# Altium footprint library texas.PCBLIB: 168 footprints (part 10 of 14)
Each footprint in its own frame and in the unit in brackets; x right, y up, seen from the top. Pads: shape width x height; smd on the part's side, far side on the other; paste and mask are expansions set on the pad; w line width, h text height; cw(c..) or ccw(c..) is an arc to the next point about the centre after c.
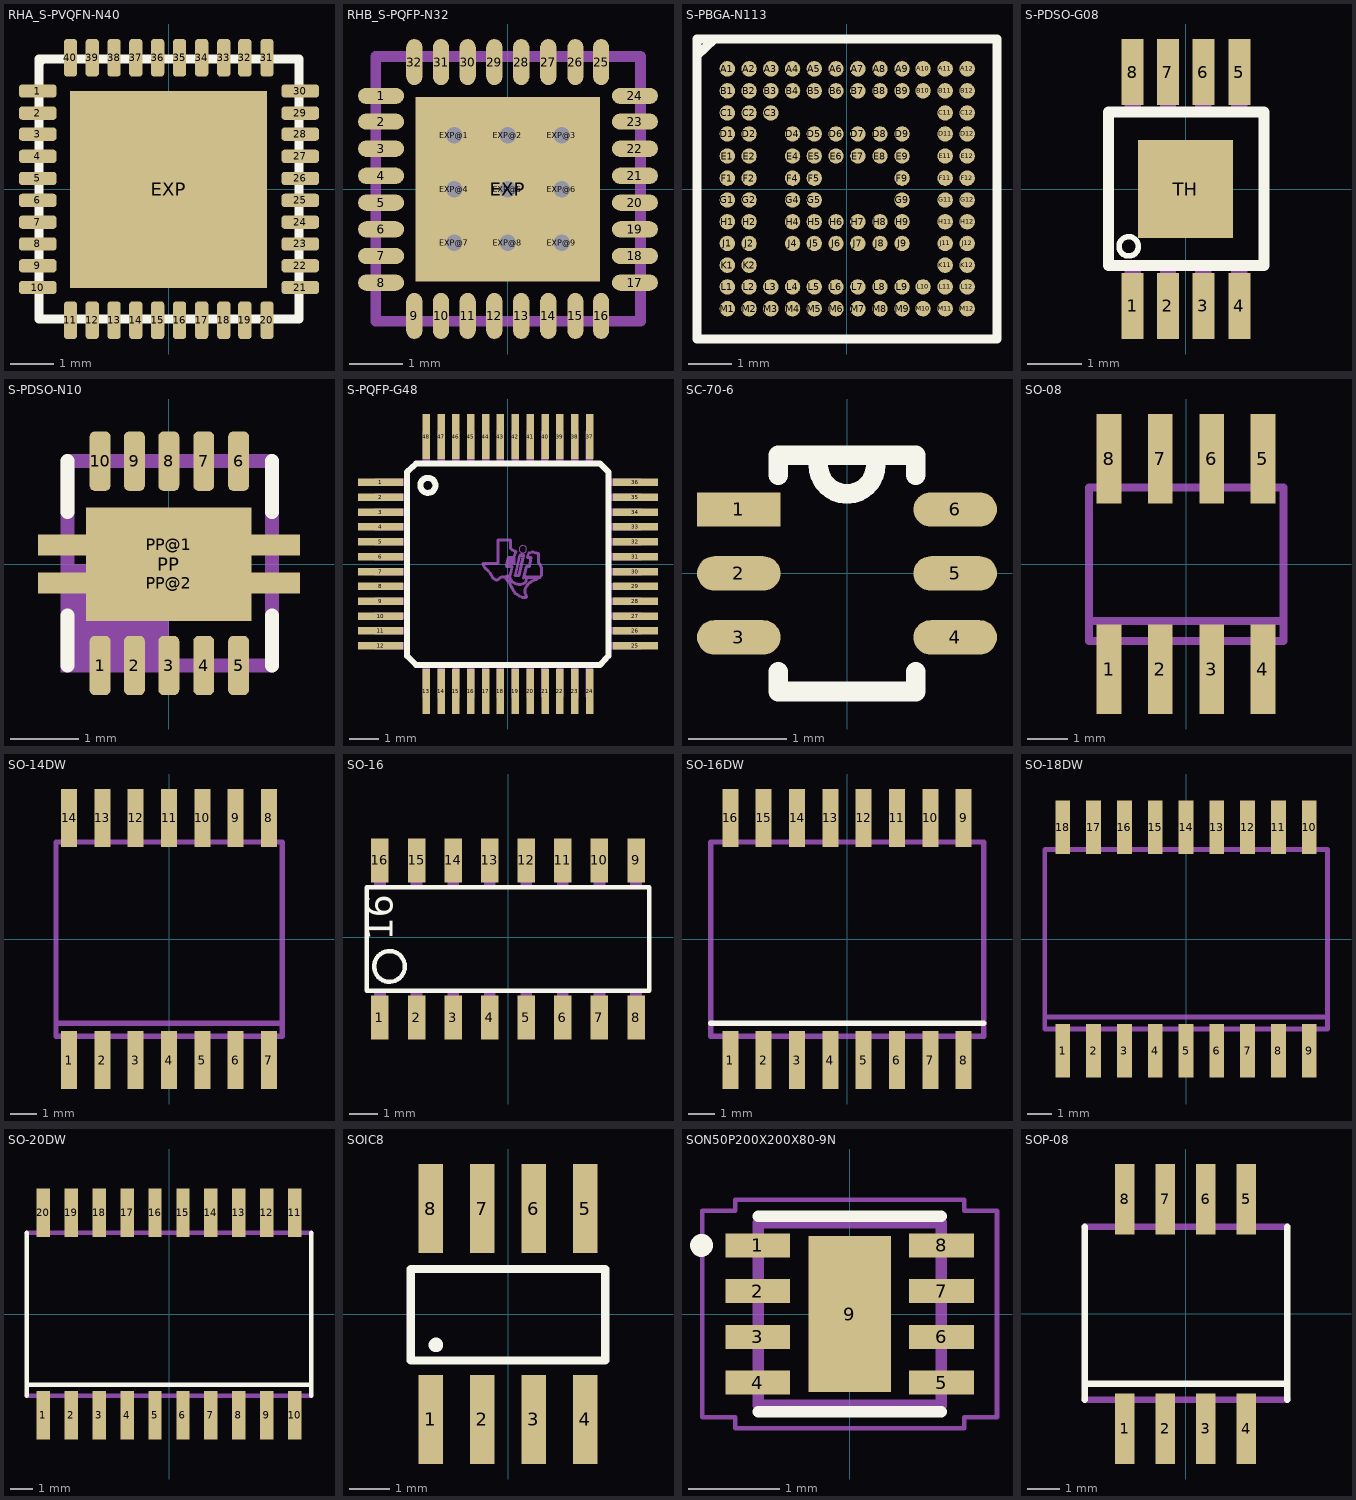
[diagram p9: the footprints below, top view; thin cyan lines are the x and y axes]

## RHA_S-PVQFN-N40 [mil]
pads (41):
  rrect50% 34x12 smd: 1(-118.11,89) 2(-118.11,69) 3(-118.11,50) 4(-118.11,30) 5(-118.11,10) 6(-118.11,-9.84) 7(-118.11,-29.53) 8(-118.11,-49.21) 9(-118.11,-68.9) 10(-118.11,-88.58) 21(119,-88.58) 22(119,-68.9) 23(119,-49.21) 24(119,-29.53) 25(119,-9.84) 26(119,10) 27(119,30) 28(119,50) 29(119,69) 30(119,89)
  rrect50% 12x34 smd: 11(-88.58,-118.11) 12(-68.9,-118.11) 13(-49.21,-118.11) 14(-29.53,-118.11) 15(-9.84,-118.11) 16(10,-118.11) 17(30,-118.11) 18(50,-118.11) 19(69,-118.11) 20(89,-118.11) 31(89,119) 32(69,119) 33(50,119) 34(30,119) 35(10,119) 36(-9.84,119) 37(-29.53,119) 38(-49.21,119) 39(-68.9,119) 40(-88.58,119)
  rect 178x178 smd: EXP(0,0)
Top Overlay:
  lines w8: -117.06,114 -113.19,118 ; -117.06,-117.06 -117.06,118 118,118 118,-117.06 -117.06,-117.06
Top Paste:
  circle w0: c-88.58,108 r5
  circle w0: c-68.9,108 r5
  circle w0: c-49.21,108 r5
  circle w0: c-29.53,108 r5
  circle w0: c-9.84,108 r5
  circle w0: c10,108 r5
  circle w0: c30,108 r5
  circle w0: c50,108 r5
  circle w0: c69,108 r5
  circle w0: c89,108 r5
  circle w0: c108,89 r5
  circle w0: c108,69 r5
  circle w0: c108,50 r5
  circle w0: c108,30 r5
  circle w0: c108,10 r5
  circle w0: c108,-9.84 r5
  circle w0: c108,-29.53 r5
  circle w0: c108,-49.21 r5
  circle w0: c108,-68.9 r5
  circle w0: c108,-88.58 r5
  circle w0: c89,-107.28 r5
  circle w0: c69,-107.28 r5
  circle w0: c50,-107.28 r5
  circle w0: c30,-107.28 r5
  circle w0: c10,-107.28 r5
  circle w0: c-9.84,-107.28 r5
  circle w0: c-29.53,-107.28 r5
  circle w0: c-49.21,-107.28 r5
  circle w0: c-68.9,-107.28 r5
  circle w0: c-88.58,-107.28 r5
  circle w0: c-107.28,-88.58 r5
  circle w0: c-107.28,-68.9 r5
  circle w0: c-107.28,-49.21 r5
  circle w0: c-107.28,-29.53 r5
  circle w0: c-107.28,-9.84 r5
  circle w0: c-107.28,10 r5
  circle w0: c-107.28,30 r5
  circle w0: c-107.28,50 r5
  circle w0: c-107.28,69 r5
  circle w0: c-107.28,89 r5
  rectangle: 30,-76.77 77,-29.53
  rectangle: -23.62,-76.77 24,-29.53
  rectangle: -76.77,-76.77 -29.53,-29.53
  rectangle: 30,30 77,77
  rectangle: -23.62,30 24,77
  rectangle: 30,-23.62 77,24
  rectangle: -76.77,-23.62 -29.53,24
  rectangle: -23.62,-23.62 24,24
  rectangle: -76.77,30 -29.53,77
  region: -93.08,133.3 -93.08,107.7 -84.08,107.7 -84.08,133.3
  region: -73.4,133.3 -73.4,107.7 -64.4,107.7 -64.4,133.3
  region: -53.71,133.3 -53.71,107.7 -44.71,107.7 -44.71,133.3
  region: -34.03,133.3 -34.03,107.7 -25.03,107.7 -25.03,133.3
  region: -14.32,133.32 -14.32,107.68 -5.32,107.68 -5.32,133.32
  region: 5.52,133.48 5.52,107.52 14.52,107.52 14.52,133.48
  region: 25.5,133.5 25.5,107.5 34.5,107.5 34.5,133.5
  region: 45.5,133.5 45.5,107.5 54.5,107.5 54.5,133.5
  region: 65,133 65,108 74,108 74,133
  region: 84.5,133.5 84.5,107.5 93.5,107.5 93.5,133.5
  region: 133,94 108,94 108,84 133,84
  region: 133,74 108,74 108,64 133,64
  region: 133,55 108,55 108,45 133,45
  region: 133,35 108,35 108,25 133,25
  region: 133,15 108,15 108,5 133,5
  region: 133,-4.92 108,-4.92 108,-14.76 133,-14.76
  region: 133,-24.61 108,-24.61 108,-34.45 133,-34.45
  region: 133,-44.29 108,-44.29 108,-54.13 133,-54.13
  region: 133,-63.98 108,-63.98 108,-73.82 133,-73.82
  region: 133,-83.66 108,-83.66 108,-93.5 133,-93.5
  region: 93.92,-133.08 93.92,-107.08 84.08,-107.08 84.08,-133.08
  region: 74.42,-132.58 74.42,-107.58 64.58,-107.58 64.58,-132.58
  region: 54.92,-133.08 54.92,-107.08 45.08,-107.08 45.08,-133.08
  region: 34.92,-133.08 34.92,-107.08 25.08,-107.08 25.08,-133.08
  region: 14.94,-133.06 14.94,-107.1 5.1,-107.1 5.1,-133.06
  region: -4.9,-132.9 -4.9,-107.26 -14.74,-107.26 -14.74,-132.9
  region: -24.61,-132.87 -24.61,-107.28 -34.45,-107.28 -34.45,-132.87
  region: -44.29,-132.87 -44.29,-107.28 -54.13,-107.28 -54.13,-132.87
  region: -63.98,-132.87 -63.98,-107.28 -73.82,-107.28 -73.82,-132.87
  region: -83.66,-132.87 -83.66,-107.28 -93.5,-107.28 -93.5,-132.87
  rectangle: -132.87,-93.5 -107.28,-83.66
  rectangle: -132.87,-73.82 -107.28,-63.98
  rectangle: -132.87,-54.13 -107.28,-44.29
  rectangle: -132.87,-34.45 -107.28,-24.61
  rectangle: -132.87,-14.76 -107.28,-4.92
  rectangle: -132.87,5 -107.28,15
  rectangle: -132.87,25 -107.28,35
  rectangle: -132.87,45 -107.28,55
  rectangle: -132.87,64 -107.28,74
  rectangle: -132.87,84 -107.28,94
Top Solder:
  drawing of 41 lines, arcs and shapes, not listed
Mechanical 4:
  rectangle: -93.11,122 -84.06,134
  rectangle: -73.43,122 -64.37,134
  rectangle: -53.74,122 -44.69,134
  rectangle: -34.06,122 -25,134
  rectangle: -14.37,122 -5.32,134
  rectangle: 6,122 15,134
  rectangle: 25,122 35,134
  rectangle: 45,122 54,134
  rectangle: 65,122 74,134
  rectangle: 85,122 94,134
  rectangle: 122,85 134,94
  rectangle: 122,65 134,74
  rectangle: 122,45 134,54
  rectangle: 122,25 134,35
  rectangle: 122,6 134,15
  rectangle: 122,-14.37 134,-5.32
  rectangle: 122,-34.06 134,-25
  rectangle: 122,-53.74 134,-44.69
  rectangle: 122,-73.43 134,-64.37
  rectangle: 122,-93.11 134,-84.06
  rectangle: 85,-133.86 94,-121.06
  rectangle: 65,-133.86 74,-121.06
  rectangle: 45,-133.86 54,-121.06
  rectangle: 25,-133.86 35,-121.06
  rectangle: 6,-133.86 15,-121.06
  rectangle: -14.37,-133.86 -5.32,-121.06
  rectangle: -34.06,-133.86 -25,-121.06
  rectangle: -53.74,-133.86 -44.69,-121.06
  rectangle: -73.43,-133.86 -64.37,-121.06
  rectangle: -93.11,-133.86 -84.06,-121.06
  rectangle: -133.86,-93.11 -121.06,-84.06
  rectangle: -133.86,-73.43 -121.06,-64.37
  rectangle: -133.86,-53.74 -121.06,-44.69
  rectangle: -133.86,-34.06 -121.06,-25
  rectangle: -133.86,-14.37 -121.06,-5.32
  rectangle: -133.86,6 -121.06,15
  rectangle: -133.86,25 -121.06,35
  rectangle: -133.86,45 -121.06,54
  rectangle: -133.86,65 -121.06,74
  rectangle: -133.86,85 -121.06,94

## RHB_S-PQFP-N32 [mil]
pads (42):
  rrect100% 34x12 smd: 1(-93.5,69) 2(-93.5,50) 3(-93.5,30) 4(-93.5,10) 5(-93.5,-9.84) 6(-93.5,-29.53) 7(-93.5,-49.21) 8(-93.5,-68.9) 17(94,-68.9) 18(94,-49.21) 19(94,-29.53) 20(94,-9.84) 21(94,10) 22(94,30) 23(94,50) 24(94,69)
  rrect100% 12x34 smd: 9(-68.9,-93.5) 10(-49.21,-93.5) 11(-29.53,-93.5) 12(-9.84,-93.5) 13(10,-93.5) 14(30,-93.5) 15(50,-93.5) 16(69,-93.5) 25(69,94) 26(50,94) 27(30,94) 28(10,94) 29(-9.84,94) 30(-29.53,94) 31(-49.21,94) 32(-68.9,94)
  rect 136x136 smd: EXP(0,0)
  round 24 hole 12: EXP@1(-39.37,40) EXP@2(0,40) EXP@3(40,40) EXP@4(-39.37,0) EXP@5(0,0) EXP@6(40,0) EXP@7(-39.37,-39.37) EXP@8(0,-39.37) EXP@9(40,-39.37)
Top Paste:
  region: 6,63 6,6 63,6 63,63
  region: 63,-5.91 6,-5.91 6,-62.99 63,-62.99
  region: -5.91,-62.99 -5.91,-5.91 -62.99,-5.91 -62.99,-62.99
  rectangle: -62.99,6 -5.91,63
  lines w12: -104.33,-68.9 -82.68,-68.9 ; -104.33,-49.21 -82.68,-49.21 ; -104.33,-29.53 -82.68,-29.53 ; -104.33,-9.84 -82.68,-9.84 ; -104.33,10 -82.68,10 ; -104.33,30 -82.68,30 ; -104.33,50 -82.68,50 ; -104.33,69 -82.68,69 ; -68.9,-104.33 -68.9,-82.68 ; -68.9,83 -68.9,105 ; -49.21,-104.33 -49.21,-82.68 ; -49.21,83 -49.21,105 ; -29.53,-104.33 -29.53,-82.68 ; -29.53,83 -29.53,105 ; -9.84,-104.33 -9.84,-82.68 ; -9.84,83 -9.84,105 ; 10,-104.33 10,-82.68 ; 10,83 10,105 ; 30,-104.33 30,-82.68 ; 30,83 30,105 ; 50,-104.33 50,-82.68 ; 50,83 50,105 ; 69,-104.33 69,-82.68 ; 69,83 69,105 ; 83,-68.9 105,-68.9 ; 83,-49.21 105,-49.21 ; 83,-29.53 105,-29.53 ; 83,-9.84 105,-9.84 ; 83,10 105,10 ; 83,30 105,30 ; 83,50 105,50 ; 83,69 105,69
Top Solder:
  rectangle: -68.9,-68.9 69,69
  lines w14: -104.33,-68.9 -82.68,-68.9 ; -104.33,-49.21 -82.68,-49.21 ; -104.33,-29.53 -82.68,-29.53 ; -104.33,-9.84 -82.68,-9.84 ; -104.33,10 -82.68,10 ; -104.33,30 -82.68,30 ; -104.33,50 -82.68,50 ; -104.33,69 -82.68,69 ; -68.9,-104.33 -68.9,-82.68 ; -68.9,83 -68.9,105 ; -49.21,-104.33 -49.21,-82.68 ; -49.21,83 -49.21,105 ; -29.53,-104.33 -29.53,-82.68 ; -29.53,83 -29.53,105 ; -9.84,-104.33 -9.84,-82.68 ; -9.84,83 -9.84,105 ; 10,-104.33 10,-82.68 ; 10,83 10,105 ; 30,-104.33 30,-82.68 ; 30,83 30,105 ; 50,-104.33 50,-82.68 ; 50,83 50,105 ; 69,-104.33 69,-82.68 ; 69,83 69,105 ; 83,-68.9 105,-68.9 ; 83,-49.21 105,-49.21 ; 83,-29.53 105,-29.53 ; 83,-9.84 105,-9.84 ; 83,10 105,10 ; 83,30 105,30 ; 83,50 105,50 ; 83,69 105,69
Mechanical 4:
  lines w8: -97.38,-97.38 -97.38,98 98,98 98,-97.38 -97.38,-97.38

## S-PBGA-N113 [mil]
pads (111):
  rrect100% 14x14 smd: A1(-108.27,109) A2(-88.58,109) A3(-68.9,109) A4(-49.21,109) A5(-29.53,109) A6(-9.84,109) A7(10,109) A8(30,109) A9(50,109) A10(69,109) A11(89,109) A12(109,109) B1(-108.27,89) B2(-88.58,89) B3(-68.9,89) B4(-49.21,89) B5(-29.53,89) B6(-9.84,89) B7(10,89) B8(30,89) B9(50,89) B10(69,89) B11(89,89) B12(109,89) C1(-108.27,69) C2(-88.58,69) C3(-68.9,69) C11(89,69) C12(109,69) D1(-108.27,50) D2(-88.58,50) D4(-49.21,50) D5(-29.53,50) D6(-9.84,50) D7(10,50) D8(30,50) D9(50,50) D11(89,50) D12(109,50) E1(-108.27,30) E2(-88.58,30) E4(-49.21,30) E5(-29.53,30) E6(-9.84,30) E7(10,30) E8(30,30) E9(50,30) E11(89,30) E12(109,30) F1(-108.27,10) F2(-88.58,10) F4(-49.21,10) F5(-29.53,10) F9(50,10) F11(89,10) F12(109,10) G1(-108.27,-9.84) G2(-88.58,-9.84) G4(-49.21,-9.84) G5(-29.53,-9.84) G9(50,-9.84) G11(89,-9.84) G12(109,-9.84) H1(-108.27,-29.53) H2(-88.58,-29.53) H4(-49.21,-29.53) H5(-29.53,-29.53) H6(-9.84,-29.53) H7(10,-29.53) H8(30,-29.53) H9(50,-29.53) H11(89,-29.53) H12(109,-29.53) J1(-108.27,-49.21) J2(-88.58,-49.21) J4(-49.21,-49.21) J5(-29.53,-49.21) J6(-9.84,-49.21) J7(10,-49.21) J8(30,-49.21) J9(50,-49.21) J11(89,-49.21) J12(109,-49.21) K1(-108.27,-68.9) K2(-88.58,-68.9) K11(89,-68.9) K12(109,-68.9) L1(-108.27,-88.58) L2(-88.58,-88.58) L3(-68.9,-88.58) L4(-49.21,-88.58) L5(-29.53,-88.58) L6(-9.84,-88.58) L7(10,-88.58) L8(30,-88.58) L9(50,-88.58) L10(69,-88.58) L11(89,-88.58) L12(109,-88.58) M1(-108.27,-108.27) M2(-88.58,-108.27) M3(-68.9,-108.27) M4(-49.21,-108.27) M5(-29.53,-108.27) M6(-9.84,-108.27) M7(10,-108.27) M8(30,-108.27) M9(50,-108.27) M10(69,-108.27) M11(89,-108.27) M12(109,-108.27)
Top Overlay:
  lines w8: -135.76,121 -120.08,136 ; -135.76,121 -135.76,-135.76 136,-135.76 136,136 -120.08,136 ; -135.76,121 -135.76,136 -120.08,136
Top Solder:
  circle w0: c30,-29.53 r7
  circle w0: c50,-49.21 r7
  circle w0: c-49.21,-49.21 r7
  circle w0: c50,50 r7
  circle w0: c-49.21,50 r7
  circle w0: c109,109 r7
  circle w0: c89,89 r7
  circle w0: c89,-88.58 r7
  circle w0: c109,-108.27 r7
  circle w0: c-88.58,-88.58 r7
  circle w0: c-108.27,-108.27 r7
  circle w0: c-108.27,109 r7
  circle w0: c-88.58,109 r7
  circle w0: c-68.9,109 r7
  circle w0: c-49.21,109 r7
  circle w0: c-29.53,109 r7
  circle w0: c-9.84,109 r7
  circle w0: c10,109 r7
  circle w0: c30,109 r7
  circle w0: c50,109 r7
  circle w0: c69,109 r7
  circle w0: c89,109 r7
  circle w0: c-108.27,89 r7
  circle w0: c-88.58,89 r7
  circle w0: c-68.9,89 r7
  circle w0: c-49.21,89 r7
  circle w0: c-29.53,89 r7
  circle w0: c-9.84,89 r7
  circle w0: c10,89 r7
  circle w0: c30,89 r7
  circle w0: c50,89 r7
  circle w0: c69,89 r7
  circle w0: c109,89 r7
  circle w0: c-108.27,69 r7
  circle w0: c-88.58,69 r7
  circle w0: c-68.9,69 r7
  circle w0: c89,69 r7
  circle w0: c109,69 r7
  circle w0: c-108.27,50 r7
  circle w0: c-88.58,50 r7
  circle w0: c-29.53,50 r7
  circle w0: c-9.84,50 r7
  circle w0: c10,50 r7
  circle w0: c30,50 r7
  circle w0: c89,50 r7
  circle w0: c109,50 r7
  circle w0: c-108.27,30 r7
  circle w0: c-88.58,30 r7
  circle w0: c-49.21,30 r7
  circle w0: c-29.53,30 r7
  circle w0: c-9.84,30 r7
  circle w0: c10,30 r7
  circle w0: c30,30 r7
  circle w0: c50,30 r7
  circle w0: c89,30 r7
  circle w0: c109,30 r7
  circle w0: c-108.27,10 r7
  circle w0: c-88.58,10 r7
  circle w0: c-49.21,10 r7
  circle w0: c-29.53,10 r7
  circle w0: c50,10 r7
  circle w0: c89,10 r7
  circle w0: c109,10 r7
  circle w0: c-108.27,-9.84 r7
  circle w0: c-88.58,-9.84 r7
  circle w0: c-49.21,-9.84 r7
  circle w0: c-29.53,-9.84 r7
  circle w0: c50,-9.84 r7
  circle w0: c89,-9.84 r7
  circle w0: c109,-9.84 r7
  circle w0: c-108.27,-29.53 r7
  circle w0: c-88.58,-29.53 r7
  circle w0: c-49.21,-29.53 r7
  circle w0: c-29.53,-29.53 r7
  circle w0: c-9.84,-29.53 r7
  circle w0: c10,-29.53 r7
  circle w0: c50,-29.53 r7
  circle w0: c89,-29.53 r7
  circle w0: c109,-29.53 r7
  circle w0: c-108.27,-49.21 r7
  circle w0: c-88.58,-49.21 r7
  circle w0: c-29.53,-49.21 r7
  circle w0: c-9.84,-49.21 r7
  circle w0: c10,-49.21 r7
  circle w0: c30,-49.21 r7
  circle w0: c89,-49.21 r7
  circle w0: c109,-49.21 r7
  circle w0: c-108.27,-68.9 r7
  circle w0: c-88.58,-68.9 r7
  circle w0: c89,-68.9 r7
  circle w0: c109,-68.9 r7
  circle w0: c-108.27,-88.58 r7
  circle w0: c-68.9,-88.58 r7
  circle w0: c-49.21,-88.58 r7
  circle w0: c-29.53,-88.58 r7
  circle w0: c-9.84,-88.58 r7
  circle w0: c10,-88.58 r7
  circle w0: c30,-88.58 r7
  circle w0: c50,-88.58 r7
  circle w0: c69,-88.58 r7
  circle w0: c109,-88.58 r7
  circle w0: c-88.58,-108.27 r7
  circle w0: c-68.9,-108.27 r7
  circle w0: c-49.21,-108.27 r7
  circle w0: c-29.53,-108.27 r7
  circle w0: c-9.84,-108.27 r7
  circle w0: c10,-108.27 r7
  circle w0: c30,-108.27 r7
  circle w0: c50,-108.27 r7
  circle w0: c69,-108.27 r7
  circle w0: c89,-108.27 r7

## S-PDSO-G08 [mil]
pads (9):
  rect 16x48 smd: 1(-38.39,-84.91) 2(-12.8,-84.91) 3(13,-84.91) 4(39,-84.91) 5(39,85) 6(13,85) 7(-12.8,85) 8(-38.39,85)
  rect 69x71 smd: TH(0,0)
Top Overlay:
  circle w4: c-41.34,-41.6 r7
  lines w8: -56.1,-55.38 -56.1,56 57,56 57,-55.38 -56.1,-55.38
Top Paste:
  rectangle: -32.48,-33.46 33,34
Top Solder:
  rectangle: -33.46,-34.45 34,35
Mechanical 4:
  region: -32.48,99 -44.29,99 -44.29,59 -32.48,59
  region: -6.89,99 -18.7,99 -18.7,59 -6.89,59
  region: 19,99 7,99 7,59 19,59
  region: 45,99 33,99 33,59 45,59
  rectangle: 33,-98.43 45,-58.53
  rectangle: 7,-98.43 19,-58.53
  rectangle: -18.7,-98.43 -6.89,-58.53
  rectangle: -44.29,-98.43 -32.48,-58.53

## S-PDSO-N10 [mil]
pads (13):
  rrect50% 12x34 smd: 1(-39.37,-58.07) 2(-19.68,-58.07) 3(0,-58.07) 4(20,-58.07) 5(40,-58.07) 6(40,59) 7(20,59) 8(0,59) 9(-19.68,59) 10(-39.37,59)
  rect 95x65 smd: PP(0,0)
  rect 150x12 smd: PP@1(0,11) PP@2(0,-10.83)
Top Overlay:
  lines w8: -58.07,-58.07 -58.07,-29.43 ; -58.07,30 -58.07,59 ; 59,-58.07 59,-29.43 ; 59,30 59,59
Top Paste:
  circle w0: c-39.37,46 r5
  circle w0: c-19.68,46 r5
  circle w0: c0,46 r5
  circle w0: c20,46 r5
  circle w0: c40,46 r5
  circle w0: c40,-45.87 r5
  circle w0: c20,-45.87 r5
  circle w0: c0,-45.87 r5
  circle w0: c-19.68,-45.87 r5
  circle w0: c-39.37,-45.87 r5
  region: 75,16 53,16 53,6 75,6
  region: 75,-5.91 53,-5.91 53,-15.75 75,-15.75
  region: -43.87,72.98 -43.87,46.02 -34.87,46.02 -34.87,72.98
  region: -24.19,72.98 -24.19,46.02 -15.19,46.02 -15.19,72.98
  region: -4.24,73.24 -4.24,45.76 4.76,45.76 4.76,73.24
  region: 16,73 16,46 25,46 25,73
  region: 35,73 35,46 44,46 44,73
  region: 44.03,-72.85 44.03,-45.85 34.97,-45.85 34.97,-72.85
  region: 25.03,-72.85 25.03,-45.85 15.97,-45.85 15.97,-72.85
  region: 4.79,-73.09 4.79,-45.61 -4.27,-45.61 -4.27,-73.09
  region: -15.16,-72.83 -15.16,-45.87 -24.21,-45.87 -24.21,-72.83
  region: -34.84,-72.83 -34.84,-45.87 -43.9,-45.87 -43.9,-72.83
  region: 47,32 6,32 6,6 47,6
  region: 47,-5.91 6,-5.91 6,-31.5 47,-31.5
  rectangle: -46.26,-31.5 -5.91,-5.91
  rectangle: -46.26,6 -5.91,32
  rectangle: -74.8,-15.75 -52.17,-5.91
  rectangle: -74.8,6 -52.17,16
Top Solder:
  circle w0: c-39.37,46 r7
  circle w0: c-19.68,46 r7
  circle w0: c0,46 r7
  circle w0: c20,46 r7
  circle w0: c40,46 r7
  circle w0: c40,-45.87 r7
  circle w0: c20,-45.87 r7
  circle w0: c0,-45.87 r7
  circle w0: c-19.68,-45.87 r7
  circle w0: c-39.37,-45.87 r7
  region: 76,17 53,17 53,5 76,5
  region: 76,-4.92 53,-4.92 53,-16.73 76,-16.73
  region: -32.48,76 -46.26,76 -46.26,46 -32.48,46
  region: -12.8,76 -26.57,76 -26.57,46 -12.8,46
  region: 7,76 -6.89,76 -6.89,46 7,46
  region: 27,76 13,76 13,46 27,46
  region: 47,76 33,76 33,46 47,46
  rectangle: 33,-75.79 47,-45.87
  rectangle: 13,-75.79 27,-45.87
  rectangle: -6.89,-75.79 7,-45.87
  rectangle: -26.57,-75.79 -12.8,-45.87
  rectangle: -46.26,-75.79 -32.48,-45.87
  rectangle: -48.23,-33.46 49,34
  rectangle: -75.79,-16.73 -52.17,-4.92
  rectangle: -75.79,5 -52.17,17
Mechanical 4:
  rectangle: -62.01,-62.01 0,0
  lines w8: -58.07,-58.07 -58.07,59 59,59 59,-58.07 -58.07,-58.07

## S-PQFP-G48 [mil]
pads (48):
  rect 60x10 smd: 1(-169.29,109) 2(-169.29,89) 3(-169.29,69) 4(-169.29,50) 5(-169.29,30) 6(-169.29,10) 7(-169.29,-9.84) 8(-169.29,-29.53) 9(-169.29,-49.21) 10(-169.29,-68.9) 11(-169.29,-88.58) 12(-169.29,-108.27) 25(170,-108.27) 26(170,-88.58) 27(170,-68.9) 28(170,-49.21) 29(170,-29.53) 30(170,-9.84) 31(170,10) 32(170,30) 33(170,50) 34(170,69) 35(170,89) 36(170,109)
  rect 10x60 smd: 13(-108.27,-169.29) 14(-88.58,-169.29) 15(-68.9,-169.29) 16(-49.21,-169.29) 17(-29.53,-169.29) 18(-9.84,-169.29) 19(10,-169.29) 20(30,-169.29) 21(50,-169.29) 22(69,-169.29) 23(89,-169.29) 24(109,-169.29) 37(109,170) 38(89,170) 39(69,170) 40(50,170) 41(30,170) 42(10,170) 43(-9.84,170) 44(-29.53,170) 45(-49.21,170) 46(-68.9,170) 47(-88.58,170) 48(-108.27,170)
Top Overlay:
  circle w8: c-106.3,105 r10
  lines w8: -133.86,-122.05 -122.05,-133.86 123,-133.86 134,-122.05 134,123 123,134 -122.05,134 -133.86,123 -133.86,-122.05
Mechanical 4:
  drawing of 146 lines, arcs and shapes, not listed

## SC-70-6 [mm]
height 1.1
pads (6):
  rect 0.85x0.35 smd: 1(-1.1,0.65)
  oval 0.85x0.35 smd: 2(-1.1,0) 3(-1.1,-0.65) 4(1.1,-0.65) 5(1.1,0) 6(1.1,0.65)
Top Overlay:
  lines w0.2: -0.7,-1 -0.7,-1.2 0.7,-1.2 0.7,-1 ; -0.7,1 -0.7,1.2 0.7,1.2 0.7,1 ; -0.292,1.1 ccw(c0,1.1) 0.292,1.1

## SO-08 [mil]
pads (8):
  rect 24x87 smd: 1(-75,-102.36) 2(-25,-102.36) 3(25,-102.36) 4(75,-102.36) 5(75,103) 6(25,103) 7(-25,103) 8(-75,103)
Mechanical 4:
  rectangle: -84.65,-122.05 -65.35,-78.74
  rectangle: -34.65,-122.05 -15.35,-78.74
  rectangle: 16,-122.05 35,-78.74
  rectangle: 66,-122.05 85,-78.74
  rectangle: 66,79 85,123
  rectangle: 16,79 35,123
  rectangle: -34.65,79 -15.35,123
  rectangle: -84.65,79 -65.35,123
  lines w8: -94.49,-55.12 -94.49,-74.8 95,-74.8 95,-55.12 ; -94.49,-55.12 -94.49,75 95,75 95,-55.12 ; -94.49,-55.12 95,-55.12

## SO-14DW [mil]
pads (14):
  rect 24x87 smd: 1(-150,-181.1) 2(-100,-181.1) 3(-50,-181.1) 4(0,-181.1) 5(50,-181.1) 6(100,-181.1) 7(150,-181.1) 8(150,182) 9(100,182) 10(50,182) 11(0,182) 12(-50,182) 13(-100,182) 14(-150,182)
Mechanical 4:
  rectangle: -159.65,-209.45 -140.35,-149.61
  rectangle: -109.65,-209.45 -90.35,-149.61
  rectangle: -59.65,-209.45 -40.35,-149.61
  rectangle: -9.65,-209.45 10,-149.61
  rectangle: 41,-209.45 60,-149.61
  rectangle: 91,-209.45 110,-149.61
  rectangle: 141,-209.45 160,-149.61
  rectangle: 141,150 160,210
  rectangle: 91,150 110,210
  rectangle: 41,150 60,210
  rectangle: -9.65,150 10,210
  rectangle: -59.65,150 -40.35,210
  rectangle: -109.65,150 -90.35,210
  rectangle: -159.65,150 -140.35,210
  lines w8: -169.49,-125.98 -169.49,-145.67 170,-145.67 170,-125.98 ; -169.49,-125.98 -169.49,146 170,146 170,-125.98 ; -169.49,-125.98 170,-125.98

## SO-16 [mil]
pads (16):
  rect 24x60 smd: 1(-175,-110) 2(-125,-110) 3(-75,-110) 4(-25,-110) 5(25,-110) 6(75,-110) 7(125,-110) 8(175,-110) 9(175,105) 10(125,105) 11(75,105) 12(25,105) 13(-25,105) 14(-75,105) 15(-125,105) 16(-175,105)
Top Overlay:
  circle w6: c-162,-40 r21
  lines w6: -193,-73 -193,68 193,68 193,-73 -193,-73
  text "16" at -145,-5 h62
Mechanical 4:
  rectangle: 167,-114 183,-74
  rectangle: 117,-114 133,-74
  rectangle: 67,-114 83,-74
  rectangle: 17,-114 33,-74
  rectangle: -33,-114 -17,-74
  rectangle: -83,-114 -67,-74
  rectangle: -133,-114 -117,-74
  rectangle: -183,-114 -167,-74
  rectangle: -183,69 -167,109
  rectangle: -133,69 -117,109
  rectangle: -83,69 -67,109
  rectangle: -33,69 -17,109
  rectangle: 17,69 33,109
  rectangle: 67,69 83,109
  rectangle: 117,69 133,109
  rectangle: 167,69 183,109

## SO-16DW [mil]
pads (16):
  rect 24x87 smd: 1(-175,-181.1) 2(-125,-181.1) 3(-75,-181.1) 4(-25,-181.1) 5(25,-181.1) 6(75,-181.1) 7(125,-181.1) 8(175,-181.1) 9(175,182) 10(125,182) 11(75,182) 12(25,182) 13(-25,182) 14(-75,182) 15(-125,182) 16(-175,182)
Top Overlay:
  lines w8: -204.33,-125.98 205,-125.98
Mechanical 4:
  rectangle: -184.65,150 -165.35,210
  rectangle: -134.65,150 -115.35,210
  rectangle: -84.65,150 -65.35,210
  rectangle: -34.65,150 -15.35,210
  rectangle: 16,150 35,210
  rectangle: 66,150 85,210
  rectangle: 116,150 135,210
  rectangle: 166,150 185,210
  rectangle: 166,-209.45 185,-149.61
  rectangle: 116,-209.45 135,-149.61
  rectangle: 66,-209.45 85,-149.61
  rectangle: 16,-209.45 35,-149.61
  rectangle: -34.65,-209.45 -15.35,-149.61
  rectangle: -84.65,-209.45 -65.35,-149.61
  rectangle: -134.65,-209.45 -115.35,-149.61
  rectangle: -184.65,-209.45 -165.35,-149.61
  lines w8: -204.33,-145.67 -204.33,146 205,146 205,-145.67 -204.33,-145.67

## SO-18DW [mil]
pads (18):
  rect 24x87 smd: 1(-200,-181.1) 2(-150,-181.1) 3(-100,-181.1) 4(-50,-181.1) 5(0,-181.1) 6(50,-181.1) 7(100,-181.1) 8(150,-181.1) 9(200,-181.1) 10(200,182) 11(150,182) 12(100,182) 13(50,182) 14(0,182) 15(-50,182) 16(-100,182) 17(-150,182) 18(-200,182)
Mechanical 4:
  rectangle: -209.65,-209.45 -190.35,-149.61
  rectangle: -159.65,-209.45 -140.35,-149.61
  rectangle: -109.65,-209.45 -90.35,-149.61
  rectangle: -59.65,-209.45 -40.35,-149.61
  rectangle: -9.65,-209.45 10,-149.61
  rectangle: 41,-209.45 60,-149.61
  rectangle: 91,-209.45 110,-149.61
  rectangle: 141,-209.45 160,-149.61
  rectangle: 191,-209.45 210,-149.61
  rectangle: 191,150 210,210
  rectangle: 141,150 160,210
  rectangle: 91,150 110,210
  rectangle: 41,150 60,210
  rectangle: -9.65,150 10,210
  rectangle: -59.65,150 -40.35,210
  rectangle: -109.65,150 -90.35,210
  rectangle: -159.65,150 -140.35,210
  rectangle: -209.65,150 -190.35,210
  lines w8: -229.33,-125.98 -229.33,-145.67 230,-145.67 230,-125.98 ; -229.33,-125.98 -229.33,146 230,146 230,-125.98 ; -229.33,-125.98 230,-125.98

## SO-20DW [mil]
pads (20):
  rect 24x87 smd: 1(-225,-181.1) 2(-175,-181.1) 3(-125,-181.1) 4(-75,-181.1) 5(-25,-181.1) 6(25,-181.1) 7(75,-181.1) 8(125,-181.1) 9(175,-181.1) 10(225,-181.1) 11(225,182) 12(175,182) 13(125,182) 14(75,182) 15(25,182) 16(-25,182) 17(-75,182) 18(-125,182) 19(-175,182) 20(-225,182)
Top Overlay:
  lines w8: -254.33,-145.67 -254.33,-125.98 ; -254.33,146 -254.33,-125.98 ; 255,-145.67 255,146 ; 255,-125.98 -254.33,-125.98
Mechanical 4:
  rectangle: -234.65,-209.45 -215.35,-149.61
  rectangle: -184.65,-209.45 -165.35,-149.61
  rectangle: -134.65,-209.45 -115.35,-149.61
  rectangle: -84.65,-209.45 -65.35,-149.61
  rectangle: -34.65,-209.45 -15.35,-149.61
  rectangle: 16,-209.45 35,-149.61
  rectangle: 66,-209.45 85,-149.61
  rectangle: 116,-209.45 135,-149.61
  rectangle: 166,-209.45 185,-149.61
  rectangle: 216,-209.45 235,-149.61
  rectangle: 216,150 235,210
  rectangle: 166,150 185,210
  rectangle: 116,150 135,210
  rectangle: 66,150 85,210
  rectangle: 16,150 35,210
  rectangle: -34.65,150 -15.35,210
  rectangle: -84.65,150 -65.35,210
  rectangle: -134.65,150 -115.35,210
  rectangle: -184.65,150 -165.35,210
  rectangle: -234.65,150 -215.35,210
  lines w8: -254.33,-145.67 255,-145.67 ; -254.33,146 255,146

## SOIC8 [mil]
pads (8):
  rect 23.62x86.61 smd: 1(-75,-102.36) 2(-25,-102.36) 3(25,-102.36) 4(75,-102.36) 5(75,102.36) 6(25,102.36) 7(-25,102.36) 8(-75,102.36)
Top Overlay:
  circle w12: c-70,-30 r1
  lines w8: -94.48,42.74 -94.48,-45.26 94.49,-45.26 94.49,40.74 ; -94.48,43.74 94.49,43.74
3D body "User Library-SOIC-8-150.STEP": height 67.53, standoff -1.37, extent -100.71,-118.31 96.14,125.79

## SON50P200X200X80-9N [mm]
pads (9):
  rect 0.71x0.26 smd: 1(-1.005,0.75) 2(-1.005,0.25) 3(-1.005,-0.25) 4(-1.005,-0.75) 5(1.005,-0.75) 6(1.005,-0.25) 7(1.005,0.25) 8(1.005,0.75)
  rect 0.9x1.7 smd: 9(0,0)
Top Overlay:
  circle w0.15: c-1.619,0.75 r0.05
  lines w0.127: -1,-1.07 1,-1.07 ; -1,1.07 1,1.07
Top Paste:
  region: -0.281,0.54 0.28,0.54 0.28,-0.541 -0.281,-0.541
Mechanical 4:
  lines w0.05: -1.61,-1.13 -1.25,-1.13 -1.25,-1.25 1.25,-1.25 1.25,-1.13 1.61,-1.13 1.61,1.13 1.25,1.13 1.25,1.25 -1.25,1.25 -1.25,1.13 -1.61,1.13 -1.61,-1.13
  lines w0.127: -1,-1 -1,1 1,1 1,-1 -1,-1
3D body "User Library-SON8-2x2mm-1.step": height 0.77, standoff -0.03, extent -1,-1 1,1

## SOP-08 [mil]
pads (8):
  rect 24x87 smd: 1(-75,-141.73) 2(-25,-141.73) 3(25,-141.73) 4(75,-141.73) 5(75,141) 6(25,141) 7(-25,141) 8(-75,141)
Top Overlay:
  lines w8: -124.02,-106.3 -124.02,-86.61 ; -124.02,107 -124.02,-86.61 ; 125,-106.3 125,-86.61 ; 125,107 125,-86.61 ; -124.02,-86.61 125,-86.61
Mechanical 4:
  rectangle: -84.65,108 -65.35,161
  rectangle: -34.65,108 -15.35,161
  rectangle: 16,108 35,161
  rectangle: 66,107 85,161
  rectangle: 66,-161.42 85,-107.28
  rectangle: 16,-161.42 35,-108.27
  rectangle: -34.65,-161.42 -15.35,-107.28
  rectangle: -84.65,-161.42 -65.35,-107.28
  lines w8: -124.02,-106.3 125,-106.3 ; -124.02,107 125,107